# Altium footprint library InverterPCBLib.PcbLib: 74 footprints (part 2 of 5)
Each footprint in its own frame and in the unit in brackets; x right, y up, seen from the top. Pads: shape width x height; smd on the part's side, far side on the other; paste and mask are expansions set on the pad; w line width, h text height; cw(c..) or ccw(c..) is an arc to the next point about the centre after c.
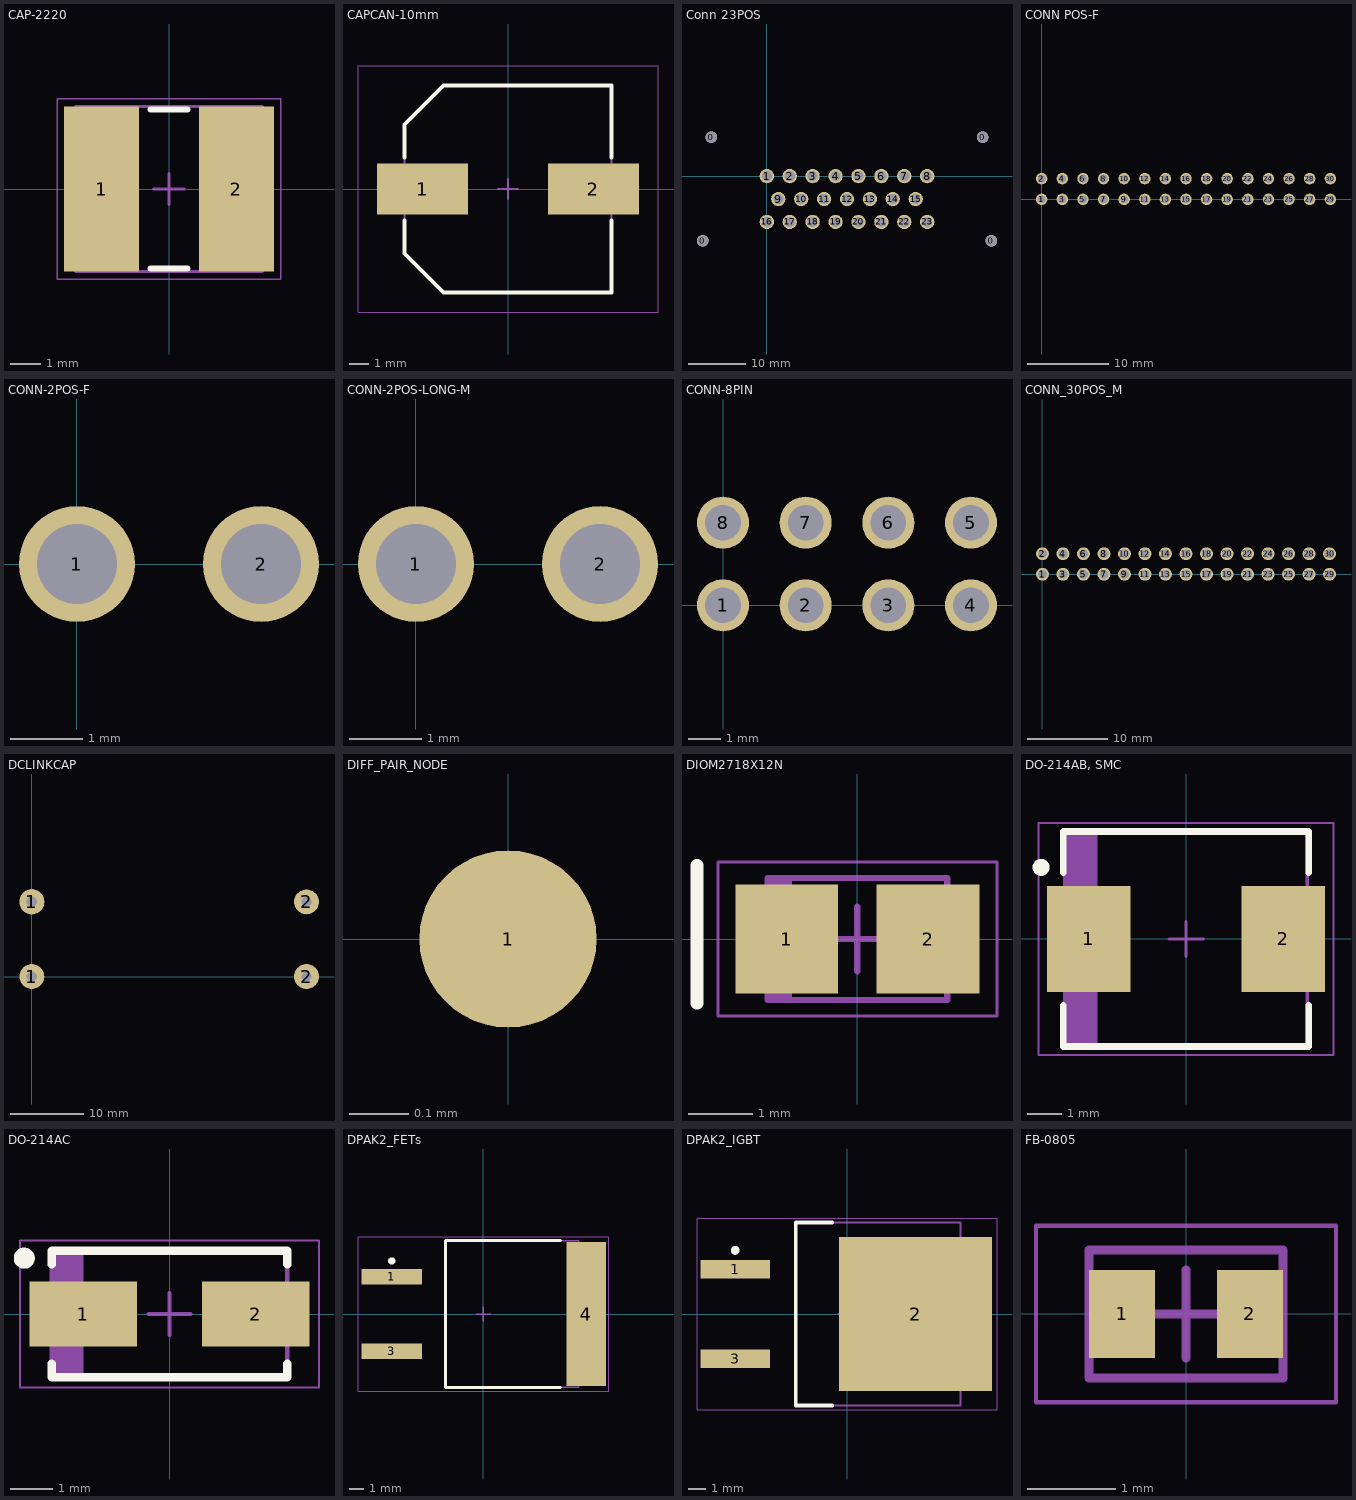
[diagram p1: the footprints below, top view; thin cyan lines are the x and y axes]

## CAP-2220 [mm] "Chip Capacitor, 2-Leads, Body 5.70x5.00mm, IPC Medium Density"
height 3.1
pads (2):
  rect 2.45x5.4 smd: 1(-2.2,0) 2(2.2,0)
Top Overlay:
  lines w0.2: -0.6,-2.6 0.6,-2.6 ; -0.6,2.6 0.6,2.6
Mechanical 13:
  lines w0.1: -3.05,-2.7 3.05,-2.7 3.05,2.7 -3.05,2.7 -3.05,-2.7
Mechanical 15:
  lines w0.05: -3.65,-2.95 3.65,-2.95 3.65,2.95 -3.65,2.95 -3.65,-2.95
  lines w0.1: -0.5,0 0.5,0 ; 0,-0.5 0,0.5
3D body "CAPC5750X31N.step": height 3.1, standoff 0, extent -3.05,-2.7 3.05,2.7

## CAPCAN-10mm [mm] "Aluminum Electrolytic Capacitor, Body 10.30x10.30x12.50mm, IPC Low Density"
height 12.5
pads (2):
  rect 4.6x2.6 smd: 1(-4.325,0) 2(4.325,0)
Top Overlay:
  lines w0.2: -5.25,-1.6 -5.25,-3.275 -3.275,-5.25 5.25,-5.25 5.25,-1.6 ; -5.25,1.6 -5.25,3.275 -3.275,5.25 5.25,5.25 5.25,1.6
Mechanical 13:
  lines w0.1: -5.25,-3.275 -5.25,3.275 -3.275,5.25 5.25,5.25 5.25,-5.25 -3.275,-5.25 -5.25,-3.275
Mechanical 15:
  lines w0.05: -7.6,-6.25 7.6,-6.25 7.6,6.25 -7.6,6.25 -7.6,-6.25
  lines w0.1: -0.5,0 0.5,0 ; 0,-0.5 0,0.5
3D body "CAPAE110103X125M.step": height 12.5, standoff 0, extent -5.5,-5.25 5.5,5.25

## Conn 23POS [mm]
pads (27):
  round 2 hole 2 unplated: 0(-11.2,-11.3) 0(-9.7,6.8) 0(37.7,6.8) 0(39.2,-11.3)
  round 2.5 hole 1.75: 1(0,0) 2(4,0) 3(8,0) 4(12,0) 5(16,0) 6(20,0) 7(24,0) 8(28,0) 9(2,-4) 10(6,-4) 11(10,-4) 12(14,-4) 13(18,-4) 14(22,-4) 15(26,-4) 16(0,-8) 17(4,-8) 18(8,-8) 19(12,-8) 20(16,-8) 21(20,-8) 22(24,-8) 23(28,-8)
3D body "776200-1--3DModel-STEP-1.STEP": height 34, standoff -4.07, extent -16.4,-20.05 44.4,12.05

## CONN POS-F [mm]
pads (32):
  round 1.4 hole 0.95 unplated: 1(0,0) 1(0,0) 2(0,2.54) 2(0,2.54) 3(2.54,0) 4(2.54,2.54) 5(5.08,0) 6(5.08,2.54) 7(7.62,0) 8(7.62,2.54) 9(10.16,0) 10(10.16,2.54) 11(12.7,0) 12(12.7,2.54) 13(15.24,0) 14(15.24,2.54) 15(17.78,0) 16(17.78,2.54) 17(20.32,0) 18(20.32,2.54) 19(22.86,0) 20(22.86,2.54) 21(25.4,0) 22(25.4,2.54) 23(27.94,0) 24(27.94,2.54) 25(30.48,0) 26(30.48,2.54) 27(33.02,0) 28(33.02,2.54) 29(35.56,0) 30(35.56,2.54)
3D body "c-1-534998-5-r-3d.stp": height 6.72, standoff -3.18, extent -1.3,-1.264 36.8,3.765

## CONN-2POS-F [mm]
pads (2):
  round 1.6 hole 1.1 unplated: 1(0,0) 2(2.54,0)
3D body "801-xx-002-10-012000.STEP": height 4.8, standoff -2.98, extent -1.27,-1.23 3.81,1.31

## CONN-2POS-LONG-M [mm]
pads (2):
  round 1.6 hole 1.1 unplated: 1(0,0) 2(2.54,0)
3D body "929715-06-01.STEP": height 19.99, standoff -8.04, extent -1.51,-1.33 3.95,1.21

## CONN-8PIN [mm]
pads (8):
  round 1.6 hole 1.1 unplated: 1(0,0) 2(2.54,0) 3(5.08,0) 4(7.62,0) 5(7.62,2.54) 6(5.08,2.54) 7(2.54,2.54) 8(0,2.54)
3D body "c-87227-4-l-3d.stp": height 10.38, standoff -3.16, extent -1.077,-1.138 8.677,3.738

## CONN_30POS_M [mm]
pads (30):
  round 1.6 hole 1.1: 1(0,0) 2(0,2.54) 3(2.54,0) 4(2.54,2.54) 5(5.08,0) 6(5.08,2.54) 7(7.62,0) 8(7.62,2.54) 9(10.16,0) 10(10.16,2.54) 11(12.7,0) 12(12.7,2.54) 13(15.24,0) 14(15.24,2.54) 15(17.78,0) 16(17.78,2.54) 17(20.32,0) 18(20.32,2.54) 19(22.86,0) 20(22.86,2.54) 21(25.4,0) 22(25.4,2.54) 23(27.94,0) 24(27.94,2.54) 25(30.48,0) 26(30.48,2.54) 27(33.02,0) 28(33.02,2.54) 29(35.56,0) 30(35.56,2.54)
3D body "929715-06-15.STEP": height 7.54, standoff -20.49, extent -1.25,-1.48 36.85,3.98

## DCLINKCAP [mm]
pads (4):
  round 3.4 hole 1.4 unplated: 1(0,0) 2(37.5,0) 2(37.5,10.2)
  oval 3.4x3.5 hole 1.4 unplated: 1(0,10.2)
3D body: height 37, standoff 0, extent -2.25,-8.9 39.75,19.1

## DIFF_PAIR_NODE [mm]
pads (1):
  round 0.3 smd: 1(0,0)

## DIOM2718X12N [mm] "Molded Diode, 2-Leads, Body 2.70x1.80mm, IPC Medium Density"
height 1.15
pads (2):
  rect 1.6x1.7 smd: 1(-1.1,0) 2(1.1,0)
Top Overlay:
  lines w0.2: -2.5,-1 -2.5,1.15
Mechanical 13:
  rectangle: -1.4,-0.95 -1.023,0.95
  lines w0.1: -1.4,-0.95 -1.4,0.95 1.4,0.95 1.4,-0.95 -1.4,-0.95
Mechanical 15:
  lines w0.05: -2.175,-1.2 -2.175,1.2 2.175,1.2 2.175,-1.2 -2.175,-1.2
  lines w0.1: -0.5,0 0.5,0 ; 0,-0.5 0,0.5
3D body "DIOM2718X12N.step": height 1.15, standoff 0, extent -1.62,-0.95 1.62,0.95

## DO-214AB, SMC [mm] "Molded Diode, 2-Leads, Body 6.86x5.91mm, IPC Medium Density"
height 2.5
pads (2):
  rect 2.45x3.1 smd: 1(-2.85,0) 2(2.85,0)
Top Overlay:
  circle w0.25: c-4.25,2.1 r0.125
  lines w0.2: -3.6,-1.95 -3.6,-3.15 3.6,-3.15 3.6,-1.95 ; -3.6,1.95 -3.6,3.15 3.6,3.15 3.6,1.95
Mechanical 13:
  rectangle: -3.555,-3.11 -2.599,3.11
  lines w0.1: -3.555,-3.11 -3.555,3.11 3.555,3.11 3.555,-3.11 -3.555,-3.11
Mechanical 15:
  lines w0.05: -4.325,-3.4 -4.325,3.4 4.325,3.4 4.325,-3.4 -4.325,-3.4
  lines w0.1: -0.5,0 0.5,0 ; 0,-0.5 0,0.5
3D body: height 2.5, standoff 0, extent -3.555,-3.11 3.555,3.11

## DO-214AC [mm] "Molded Diode, 2-Leads, Body 5.24x2.61mm, IPC Medium Density"
height 2.2
pads (2):
  rect 2.55x1.55 smd: 1(-2.05,0) 2(2.05,0)
Top Overlay:
  circle w0.25: c-3.45,1.325 r0.125
  lines w0.2: -2.8,-1.175 -2.8,-1.5 2.8,-1.5 2.8,-1.175 ; -2.8,1.175 -2.8,1.5 2.8,1.5 2.8,1.175
Mechanical 13:
  rectangle: -2.795,-1.46 -2.043,1.46
  lines w0.1: -2.795,-1.46 2.795,-1.46 2.795,1.46 -2.795,1.46 -2.795,-1.46
Mechanical 15:
  lines w0.05: -3.55,-1.75 3.55,-1.75 3.55,1.75 -3.55,1.75 -3.55,-1.75
  lines w0.1: -0.5,0 0.5,0 ; 0,-0.5 0,0.5
3D body "DIOM5226X22N.step": height 2.2, standoff 0, extent -3.015,-1.46 3.015,1.46

## DPAK2_FETs [mm] "D2-PAK, 3-Pads, Body 7.65x8.36mm (max), IPC Medium Density"
pads (3):
  rect 4.15x1.05 smd: 1(-6.25,2.54) 3(-6.25,-2.54)
  rect 2.7x9.8 smd: 4(7,0)
Top Overlay:
  circle w0.25: c-6.25,3.615 r0.125
  lines w0.2: 5.25,-5 -2.6,-5 -2.6,5 5.25,5
Mechanical 13:
  lines w0.1: -2.6,-5 -2.6,5 6.5,5 6.5,-5 -2.6,-5
Mechanical 15:
  lines w0.05: -8.55,-5.25 -8.55,5.25 8.55,5.25 8.55,-5.25 -8.55,-5.25
  lines w0.1: -0.5,0 0.5,0 ; 0,-0.5 0,0.5
3D body "DPAK254P1524X483-3N.step": height 4.83, standoff 0, extent -7.105,-5 8.135,5

## DPAK2_IGBT [mm] "D2-PAK, 3-Pads, Body 7.78x8.56mm (max), IPC Medium Density"
height 4.6
pads (3):
  rect 3.95x1.05 smd: 1(-6.35,2.54) 3(-6.35,-2.54)
  rect 8.7x8.75 smd: 2(3.9,0)
Top Overlay:
  circle w0.25: c-6.35,3.615 r0.125
  lines w0.2: -0.85,-5.2 -2.9,-5.2 -2.9,5.2 -0.85,5.2
Mechanical 13:
  lines w0.1: -2.9,-5.2 -2.9,5.2 6.45,5.2 6.45,-5.2 -2.9,-5.2
Mechanical 15:
  lines w0.05: -8.525,-5.45 -8.525,5.45 8.525,5.45 8.525,-5.45 -8.525,-5.45
  lines w0.1: -0.5,0 0.5,0 ; 0,-0.5 0,0.5
3D body "DPAK254P1542X460-3N.step": height 4.6, standoff 0, extent -7.29,-5.2 8.135,5.2

## FB-0805 [mm] "Chip Resistor, 2-Leads, Body 2.00x1.25mm, IPC Medium Density"
height 1.05
pads (2):
  rect 0.75x1 smd: 1(-0.725,0) 2(0.725,0)
Mechanical 13:
  lines w0.1: -1.1,-0.725 1.1,-0.725 1.1,0.725 -1.1,0.725 -1.1,-0.725
Mechanical 15:
  lines w0.05: -1.7,-1 1.7,-1 1.7,1 -1.7,1 -1.7,-1
  lines w0.1: -0.5,0 0.5,0 ; 0,-0.5 0,0.5
3D body "RESC2012X10N.step": height 1.05, standoff 0, extent -1.1,-0.725 1.1,0.725